# Altium footprint library chipfc_libs.PCBLIB: 337 footprints (part 12 of 22)
Each footprint in its own frame and in the unit in brackets; x right, y up, seen from the top. Pads: shape width x height; smd on the part's side, far side on the other; paste and mask are expansions set on the pad; w line width, h text height; cw(c..) or ccw(c..) is an arc to the next point about the centre after c.
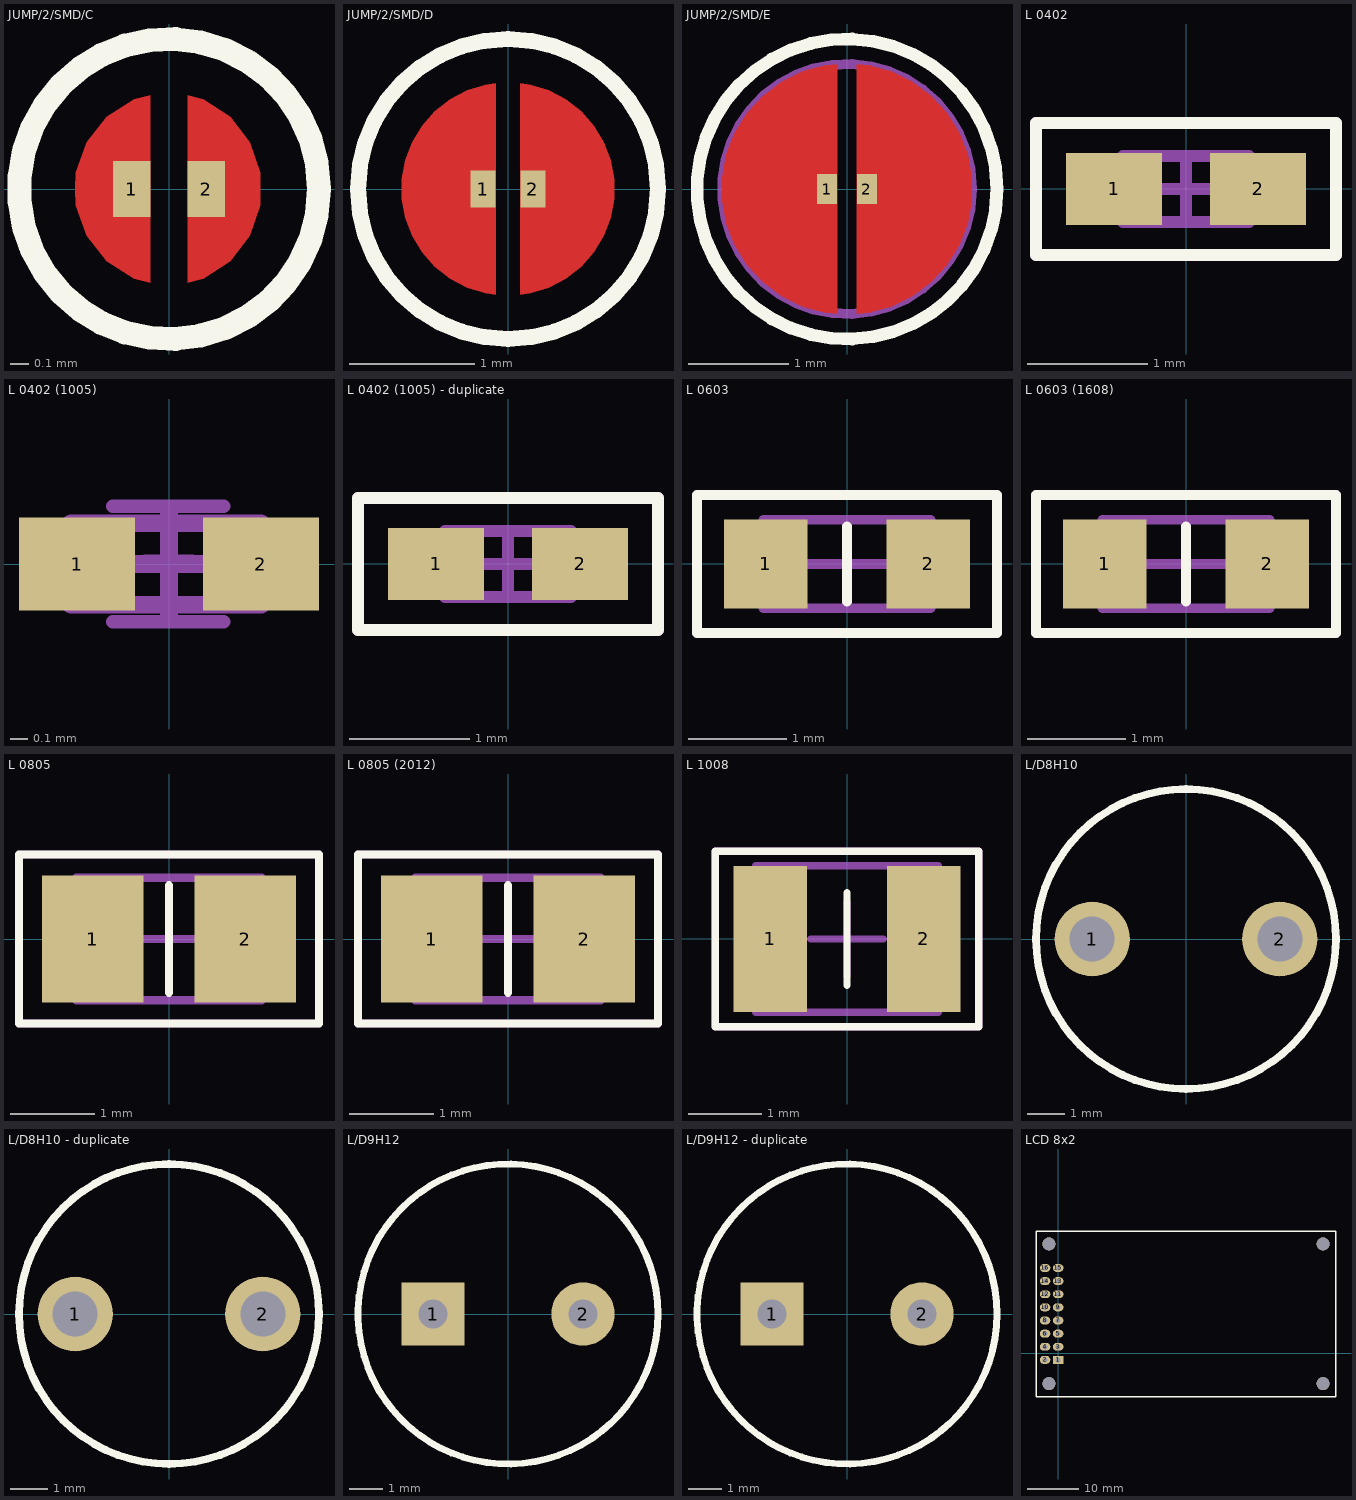
[diagram p11: the footprints below, top view; thin cyan lines are the x and y axes]

## JUMP/2/SMD/C [mm] "Chip Resistor, 2-Leads, Body 1.6x0.8mm, IPC Medium Density"
height 0.55
pads (2):
  rect 0.2x0.3 smd: 1(-0.2,0) 2(0.2,0)
Top Layer:
  region: 0.1,-0.5 0.1,0.5 0.183,0.478 0.327,0.384 0.432,0.248 0.487,0.086 0.487,0 0.487,-0.086 0.432,-0.248 0.327,-0.384 0.183,-0.478
  region: -0.1,0.5 -0.1,-0.5 -0.185,-0.48 -0.331,-0.386 -0.44,-0.251 -0.499,-0.087 -0.5,0 -0.499,0.087 -0.44,0.251 -0.331,0.386 -0.185,0.48
Top Overlay:
  circle w0.127: c0,0 r0.8
Top Solder:
  region: 0,0.6 0.119,0.6 0.34,0.509 0.509,0.34 0.6,0.119 0.6,0 0.6,-0.119 0.509,-0.34 0.34,-0.509 0.119,-0.6 0,-0.6
  region: 0,-0.6 -0.119,-0.6 -0.34,-0.509 -0.509,-0.34 -0.6,-0.119 -0.6,0 -0.6,0.119 -0.509,0.34 -0.34,0.509 -0.119,0.6 0,0.6

## JUMP/2/SMD/D [mm] "Chip Resistor, 2-Leads, Body 1.6x0.8mm, IPC Medium Density"
height 0.55
pads (2):
  rect 0.2x0.3 smd: 1(-0.2,0) 2(0.2,0)
Top Layer:
  region: 0.1,0.844 0.177,0.835 0.325,0.789 0.462,0.718 0.584,0.622 0.687,0.507 0.767,0.374 0.822,0.23 0.85,0.077 0.85,0 0.85,-0.077 0.822,-0.23 0.767,-0.374 0.687,-0.507 0.584,-0.622 0.462,-0.718 0.325,-0.789 0.177,-0.835 0.1,-0.844
  region: -0.1,-0.844 -0.177,-0.835 -0.325,-0.789 -0.462,-0.718 -0.584,-0.622 -0.687,-0.507 -0.767,-0.374 -0.822,-0.23 -0.85,-0.077 -0.85,0 -0.85,0.077 -0.822,0.23 -0.767,0.374 -0.687,0.507 -0.584,0.622 -0.462,0.718 -0.325,0.789 -0.177,0.835 -0.1,0.844
Top Overlay:
  circle w0.127: c0,0 r1.2
Top Solder:
  region: 0,-0.6 -0.119,-0.6 -0.34,-0.509 -0.509,-0.34 -0.6,-0.119 -0.6,0 -0.6,0.119 -0.509,0.34 -0.34,0.509 -0.119,0.6 0,0.6
  region: 0,0.6 0.119,0.6 0.34,0.509 0.509,0.34 0.6,0.119 0.6,0 0.6,-0.119 0.509,-0.34 0.34,-0.509 0.119,-0.6 0,-0.6
  region: 0,1 0.098,1 0.292,0.962 0.474,0.886 0.637,0.777 0.777,0.637 0.886,0.474 0.962,0.292 1,0.098 1,0 1,-0.098 0.962,-0.292 0.886,-0.474 0.777,-0.637 0.637,-0.777 0.474,-0.886 0.292,-0.962 0.098,-1 0,-1 -0.098,-1 -0.292,-0.962 -0.474,-0.886 -0.637,-0.777 -0.777,-0.637 -0.886,-0.474 -0.962,-0.292 -1,-0.098 -1,0 -1,0.098 -0.962,0.292 -0.886,0.474 -0.777,0.637 -0.637,0.777 -0.474,0.886 -0.292,0.962 -0.098,1

## JUMP/2/SMD/E [mm] "Chip Resistor, 2-Leads, Body 1.6x0.8mm, IPC Medium Density"
height 0.55
pads (2):
  rect 0.2x0.3 smd: 1(-0.2,0) 2(0.2,0)
Top Layer:
  region: -0.1,1.246 -0.216,1.237 -0.442,1.175 -0.652,1.073 -0.839,0.934 -0.998,0.762 -1.122,0.564 -1.207,0.346 -1.25,0.117 -1.25,0 -1.25,-0.117 -1.207,-0.346 -1.122,-0.564 -0.998,-0.762 -0.839,-0.934 -0.652,-1.073 -0.442,-1.175 -0.216,-1.237 -0.1,-1.246
  region: 0.1,1.246 0.216,1.237 0.442,1.175 0.652,1.073 0.839,0.934 0.998,0.762 1.122,0.564 1.207,0.346 1.25,0.117 1.25,0 1.25,-0.117 1.207,-0.346 1.122,-0.564 0.998,-0.762 0.839,-0.934 0.652,-1.073 0.442,-1.175 0.216,-1.237 0.1,-1.246
  region: 0.1,0.887 0.177,0.878 0.324,0.833 0.461,0.761 0.583,0.666 0.686,0.551 0.766,0.418 0.821,0.274 0.849,0.122 0.849,0.045 0.853,-0.035 0.831,-0.194 0.78,-0.346 0.702,-0.486 0.598,-0.609 0.474,-0.71 0.333,-0.786 0.18,-0.835 0.1,-0.844
Top Overlay:
  circle w0.127: c0,0 r1.5
Top Solder:
  region: 0,1.35 0.133,1.35 0.394,1.298 0.639,1.196 0.861,1.049 1.049,0.861 1.196,0.639 1.298,0.394 1.35,0.133 1.35,0 1.35,-0.133 1.298,-0.394 1.196,-0.639 1.049,-0.861 0.861,-1.049 0.639,-1.196 0.394,-1.298 0.133,-1.35 0,-1.35 -0.133,-1.35 -0.394,-1.298 -0.639,-1.196 -0.861,-1.049 -1.049,-0.861 -1.196,-0.639 -1.298,-0.394 -1.35,-0.133 -1.35,0 -1.35,0.133 -1.298,0.394 -1.196,0.639 -1.049,0.861 -0.861,1.049 -0.639,1.196 -0.394,1.298 -0.133,1.35
Mechanical 1:
  circle w0.1: c0,0 r1.25

## L 0402 [mm] "Chip Capacitor, 2-Leads, Body 1.0x0.5mm, IPC Medium Density"
height 0.55
pads (2):
  rect 0.8x0.6 smd: 1(-0.6,0) 2(0.6,0)
Top Overlay:
  lines w0.1: -1.25,-0.55 1.25,-0.55 1.25,0.55 -1.25,0.55 -1.25,-0.55
Mechanical 13:
  lines w0.1: -0.525,-0.275 0.525,-0.275 0.525,0.275 -0.525,0.275 -0.525,-0.275
Mechanical 15:
  lines w0.1: -0.275,0 0.275,0 ; 0,-0.275 0,0.275 ; -1.25,-0.55 1.25,-0.55 1.25,0.55 -1.25,0.55 -1.25,-0.55
3D body "User Library-Chip Inductor-L0402 (1005).step": height 0.5, standoff 0, extent -0.5,-0.3 0.5,0.3

## L 0402 (1005) [mm] "Chip Resistor, 2-Leads, Body 1.0x0.5mm, IPC Medium Density"
height 0.4
pads (2):
  rect 0.65x0.52 smd: 1(-0.515,0) 2(0.515,0)
Mechanical 13:
  lines w0.1: 0.515,-0.226 0.515,0.229 -0.549,0.229 -0.549,-0.229 0.517,-0.229
Mechanical 15:
  lines w0.1: -0.275,0 0.275,0 ; 0,-0.275 0,0.275
Mechanical 31:
  lines w0.076: -0.315,-0.323 0.305,-0.323 ; -0.315,0.323 0.305,0.323
  lines w0.102: -0.132,0.002 0.129,0.002
3D body: height 0.48, standoff -0.03, extent -0.508,-0.254 0.508,0.254

## L 0402 (1005) - duplicate [mm] "Chip Capacitor, 2-Leads, Body 1.0x0.5mm, IPC Medium Density"
height 0.55
pads (2):
  rect 0.8x0.6 smd: 1(-0.6,0) 2(0.6,0)
Top Overlay:
  lines w0.1: -1.25,-0.55 -1.25,0.55 1.25,0.55 1.25,-0.55 -1.25,-0.55
Mechanical 13:
  lines w0.1: -0.525,-0.275 -0.525,0.275 0.525,0.275 0.525,-0.275 -0.525,-0.275
Mechanical 15:
  lines w0.1: -0.275,0 0.275,0 ; 0,-0.275 0,0.275 ; -1.25,-0.55 -1.25,0.55 1.25,0.55 1.25,-0.55 -1.25,-0.55
3D body "User Library-Chip Inductor-L0402 (1005).step": height 0.5, standoff 0, extent -0.5,-0.3 0.5,0.3

## L 0603 [mm] "Chip Capacitor, 2-Leads, Body 1.6x0.8mm, IPC Medium Density"
height 0.8
pads (2):
  rect 0.85x0.9 smd: 1(-0.825,0) 2(0.825,0)
Top Overlay:
  lines w0.1: 0,-0.381 0,0.381 ; -1.525,-0.7 -1.525,0.7 1.525,0.7 1.525,-0.7 -1.525,-0.7
Mechanical 13:
  lines w0.1: -0.85,-0.45 -0.85,0.45 0.85,0.45 0.85,-0.45 -0.85,-0.45
Mechanical 15:
  lines w0.1: -0.45,0 0.45,0 ; 0,-0.45 0,0.45 ; -1.525,-0.7 -1.525,0.7 1.525,0.7 1.525,-0.7 -1.525,-0.7
3D body "User Library-Chip Inductor-L0603 (1608).step": height 0.8, standoff 0, extent -0.8,-0.475 0.8,0.475

## L 0603 (1608) [mm] "Chip Capacitor, 2-Leads, Body 1.6x0.8mm, IPC Medium Density"
height 0.8
pads (2):
  rect 0.85x0.9 smd: 1(-0.825,0) 2(0.825,0)
Top Overlay:
  lines w0.1: 0,-0.381 0,0.381 ; -1.525,-0.7 -1.525,0.7 1.525,0.7 1.525,-0.7 -1.525,-0.7
Mechanical 13:
  lines w0.1: -0.85,-0.45 -0.85,0.45 0.85,0.45 0.85,-0.45 -0.85,-0.45
Mechanical 15:
  lines w0.1: -0.45,0 0.45,0 ; 0,-0.45 0,0.45 ; -1.525,-0.7 -1.525,0.7 1.525,0.7 1.525,-0.7 -1.525,-0.7
3D body "User Library-Chip Inductor-L0603 (1608).step": height 0.8, standoff 0, extent -0.8,-0.475 0.8,0.475

## L 0805 [mm] "Chip Capacitor, 2-Leads, Body 2.0x1.3mm, IPC Medium Density"
height 0.85
pads (2):
  rect 1.2x1.5 smd: 1(-0.9,0) 2(0.9,0)
Top Overlay:
  lines w0.1: 0,-0.635 0,0.635 ; -1.775,-1 1.775,-1 1.775,1 -1.775,1 -1.775,-1
Mechanical 13:
  lines w0.1: -1.1,-0.725 1.1,-0.725 1.1,0.725 -1.1,0.725 -1.1,-0.725
Mechanical 15:
  lines w0.1: -0.5,0 0.5,0 ; 0,-0.5 0,0.5 ; -1.775,-1 -1.775,1 1.775,1 1.775,-1 -1.775,-1
3D body "User Library-Chip Inductor-L0805 (2012).step": height 0.95, standoff 0, extent -1,-0.6 1,0.6

## L 0805 (2012) [mm] "Chip Capacitor, 2-Leads, Body 2.0x1.3mm, IPC Medium Density"
height 0.85
pads (2):
  rect 1.2x1.5 smd: 1(-0.9,0) 2(0.9,0)
Top Overlay:
  lines w0.1: 0,-0.635 0,0.635 ; -1.775,-1 -1.775,1 1.775,1 1.775,-1 -1.775,-1
Mechanical 13:
  lines w0.1: -1.1,-0.725 -1.1,0.725 1.1,0.725 1.1,-0.725 -1.1,-0.725
Mechanical 15:
  lines w0.1: -0.5,0 0.5,0 ; 0,-0.5 0,0.5 ; -1.775,-1 1.775,-1 1.775,1 -1.775,1 -1.775,-1
3D body "User Library-Chip Inductor-L0805 (2012).step": height 0.95, standoff 0, extent -1,-0.6 1,0.6

## L 1008 [mm] "Chip Capacitor, 2-Leads, Body 2.0x1.3mm, IPC Medium Density"
height 0.85
pads (2):
  rect 1x2 smd: 1(-1.05,0) 2(1.05,0)
Top Overlay:
  lines w0.1: 0,-0.635 0,0.635 ; -1.8,-1.2 1.8,-1.2 1.8,1.2 -1.8,1.2 -1.8,-1.2
Mechanical 13:
  lines w0.1: -1.25,-1 1.25,-1 1.25,1 -1.25,1 -1.25,-1
Mechanical 15:
  lines w0.1: -0.5,0 0.5,0 ; 0,-0.5 0,0.5 ; -1.8,-1.2 -1.8,1.2 1.8,1.2 1.8,-1.2 -1.8,-1.2
3D body "User Library-Chip Inductor.step": height 2.2, standoff 0, extent -1.25,-1 1.25,1

## L/D8H10 [mm] "inductor Dia (7.80mm) Heigh (10.00mm)"
pads (2):
  round 2 hole 1.2: 1(-2.5,0) 2(2.5,0)
Top Overlay:
  circle w0.203: c0,0 r4
3D body "STEP-WE-TI-HV-8095-rev1.stp": height 9.5, standoff -5, extent -5.515,-5.516 5.516,5.515

## L/D8H10 - duplicate [mm] "inductor Dia (7.80mm) Heigh (10.00mm)"
pads (2):
  round 2 hole 1.2: 1(-2.5,0) 2(2.5,0)
Top Overlay:
  circle w0.203: c0,0 r4
3D body "STEP-WE-TI-HV-8095-rev1.stp": height 9.5, standoff -5, extent -5.515,-5.516 5.516,5.515

## L/D9H12 [mm] "inductor"
pads (2):
  rect 1.905x1.905 hole 0.864: 1(-2.25,0)
  round 1.905 hole 0.864: 2(2.25,0)
Top Overlay:
  circle w0.203: c0,0 r4.5
3D body "User Library-Inductor 10x12 (200 mils).STEP": height 12.13, standoff -3.87, extent -5,-5.115 5,4.885

## L/D9H12 - duplicate [mm] "inductor"
pads (2):
  rect 1.905x1.905 hole 0.864: 1(-2.25,0)
  round 1.905 hole 0.864: 2(2.25,0)
Top Overlay:
  circle w0.203: c0,0 r4.5
3D body "User Library-Inductor 10x12 (200 mils).STEP": height 12.13, standoff -3.87, extent -5,-5.115 5,4.885

## LCD 8x2 [mil]
pads (20):
  rect 80x60 / inner round 60 / far side rect 80x60 hole 38: 1(0,-50)
  oval 80x60 / inner round 60 / far side oval 80x60 hole 38: 2(-100,-50) 3(0,50) 4(-100,50) 5(0,150) 6(-100,150) 7(0,250) 8(-100,250) 9(0,350) 10(-100,350) 11(0,450) 12(-100,450) 13(0,550) 14(-100,550) 15(0,650) 16(-100,650)
  round 98.43 hole 98.43: HOLE(-70.47,832.28) HOLF(2016.14,832.28) HOLG(2016.14,-230.71) HOLH(-70.47,-230.71)
Top Overlay:
  lines w10: -168.9,-329.13 2114.57,-329.13 2114.57,927.95 -168.9,927.95 -168.9,-329.13